# Altium footprint library Connector_PinHeader_1.00mm.PcbLib: 278 footprints (part 7 of 18)
Each footprint in its own frame and in the unit in brackets; x right, y up, seen from the top. Pads: shape width x height; smd on the part's side, far side on the other; paste and mask are expansions set on the pad; w line width, h text height; cw(c..) or ccw(c..) is an arc to the next point about the centre after c.
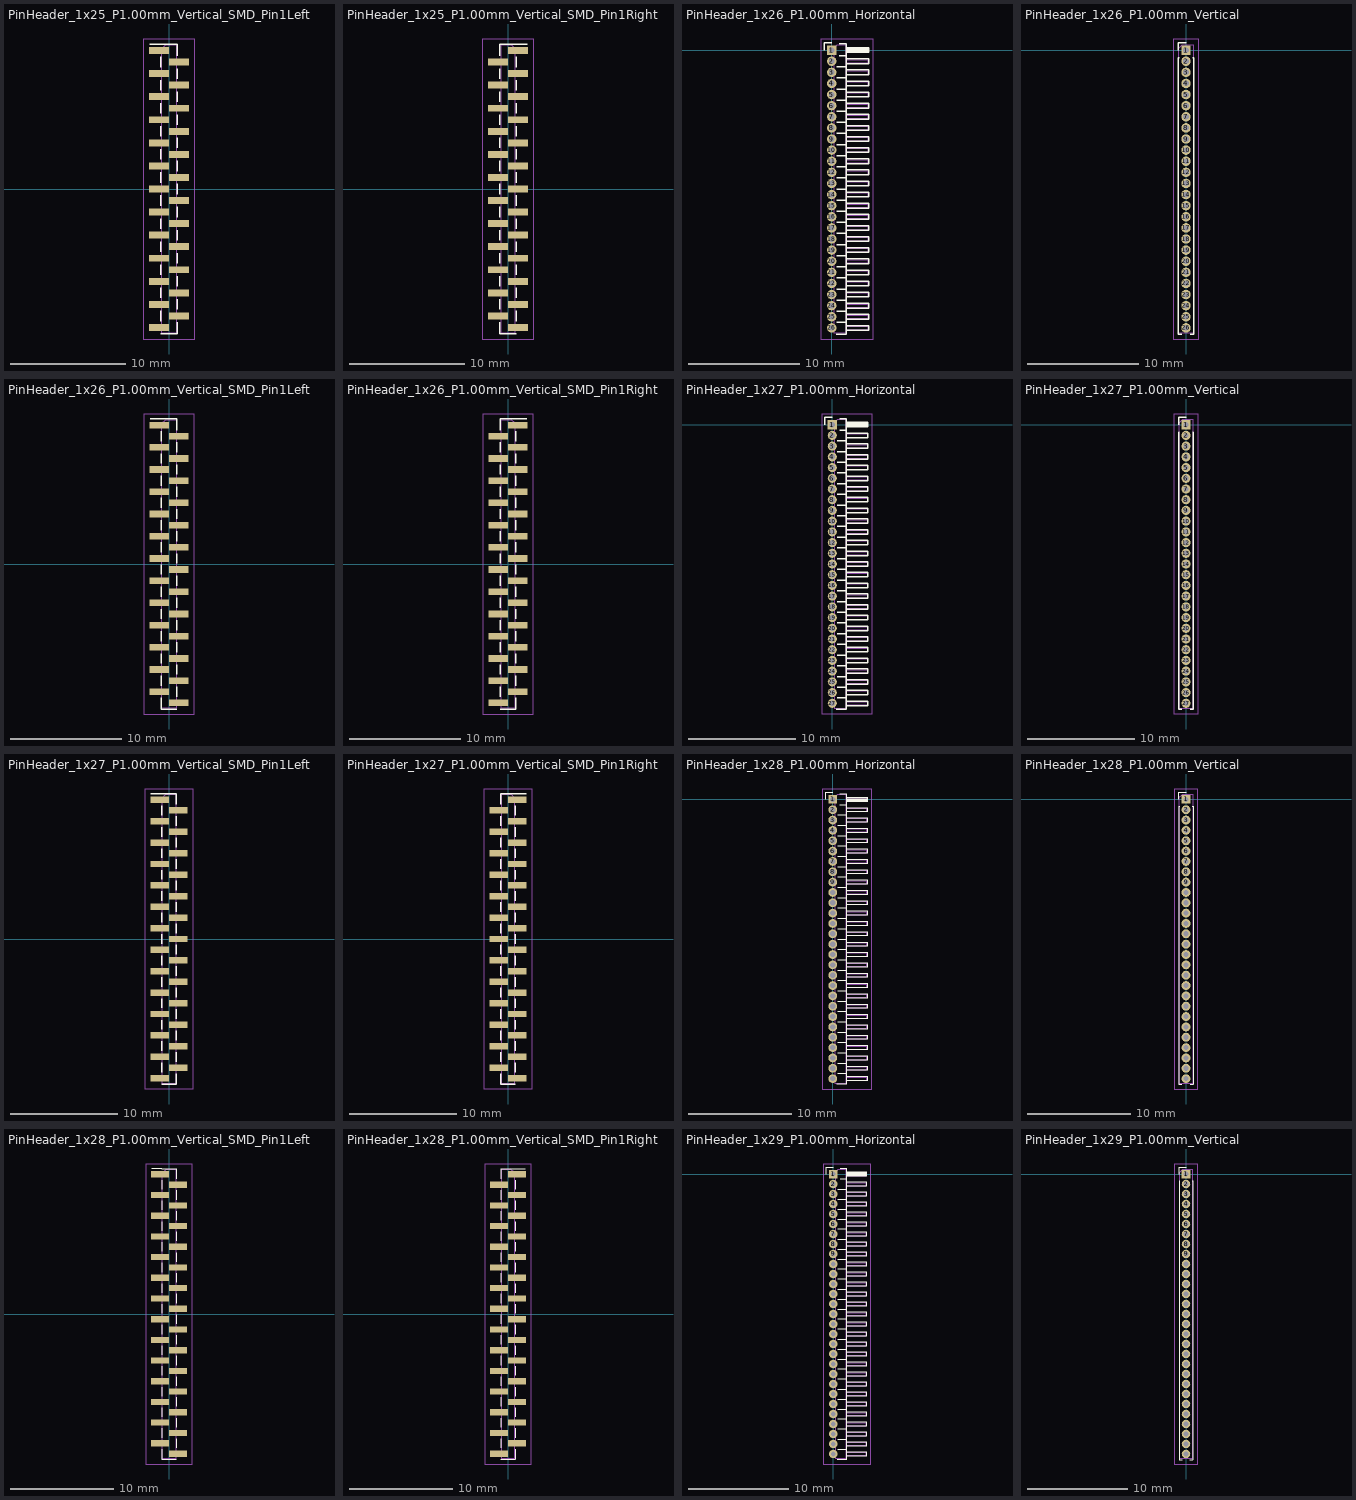
[diagram p6: the footprints below, top view; thin cyan lines are the x and y axes]

## PinHeader_1x25_P1.00mm_Vertical_SMD_Pin1Left [mm]
pads (25):
  rect 1.75x0.6 smd: 1(-0.875,12) 2(0.875,11) 3(-0.875,10) 4(0.875,9) 5(-0.875,8) 6(0.875,7) 7(-0.875,6) 8(0.875,5) 9(-0.875,4) 10(0.875,3) 11(-0.875,2) 12(0.875,1) 13(-0.875,0) 14(0.875,-1) 15(-0.875,-2) 16(0.875,-3) 17(-0.875,-4) 18(0.875,-5) 19(-0.875,-6) 20(0.875,-7) 21(-0.875,-8) 22(0.875,-9) 23(-0.875,-10) 24(0.875,-11) 25(-0.875,-12)
F.SilkS:
  lines w0.12: -1.69,12.56 -0.695,12.56 0.695,12.56 0.695,11.56 ; -0.695,-12.56 0.695,-12.56 0.695,-11.56 ; -0.695,-11.44 -0.695,-10.56 ; -0.695,-9.44 -0.695,-8.56 ; -0.695,-7.44 -0.695,-6.56 ; -0.695,-5.44 -0.695,-4.56 ; -0.695,-3.44 -0.695,-2.56 ; -0.695,-1.44 -0.695,-0.56 ; -0.695,0.56 -0.695,1.44 ; -0.695,2.56 -0.695,3.44 ; -0.695,4.56 -0.695,5.44 ; -0.695,6.56 -0.695,7.44 ; -0.695,8.56 -0.695,9.44 ; -0.695,10.56 -0.695,11.44 ; 0.695,-10.44 0.695,-9.56 ; 0.695,-8.44 0.695,-7.56 ; 0.695,-6.44 0.695,-5.56 ; 0.695,-4.44 0.695,-3.56 ; 0.695,-2.44 0.695,-1.56 ; 0.695,-0.44 0.695,0.44 ; 0.695,1.56 0.695,2.44 ; 0.695,3.56 0.695,4.44 ; 0.695,5.56 0.695,6.44 ; 0.695,7.56 0.695,8.44 ; 0.695,9.56 0.695,10.44
F.CrtYd:
  lines w0.05: -2.25,-13 2.25,-13 2.25,13 -2.25,13 -2.25,-13
F.Fab:
  lines w0.1: -0.635,-12.15 -1.25,-12.15 -1.25,-11.85 -0.635,-11.85 ; -0.635,-10.15 -1.25,-10.15 -1.25,-9.85 -0.635,-9.85 ; -0.635,-8.15 -1.25,-8.15 -1.25,-7.85 -0.635,-7.85 ; -0.635,-6.15 -1.25,-6.15 -1.25,-5.85 -0.635,-5.85 ; -0.635,-4.15 -1.25,-4.15 -1.25,-3.85 -0.635,-3.85 ; -0.635,-2.15 -1.25,-2.15 -1.25,-1.85 -0.635,-1.85 ; -0.635,-0.15 -1.25,-0.15 -1.25,0.15 -0.635,0.15 ; -0.635,1.85 -1.25,1.85 -1.25,2.15 -0.635,2.15 ; -0.635,3.85 -1.25,3.85 -1.25,4.15 -0.635,4.15 ; -0.635,5.85 -1.25,5.85 -1.25,6.15 -0.635,6.15 ; -0.635,7.85 -1.25,7.85 -1.25,8.15 -0.635,8.15 ; -0.635,9.85 -1.25,9.85 -1.25,10.15 -0.635,10.15 ; -0.635,11.85 -1.25,11.85 -1.25,12.15 -0.635,12.15 ; 0.635,-11.15 1.25,-11.15 1.25,-10.85 0.635,-10.85 ; 0.635,-9.15 1.25,-9.15 1.25,-8.85 0.635,-8.85 ; 0.635,-7.15 1.25,-7.15 1.25,-6.85 0.635,-6.85 ; 0.635,-5.15 1.25,-5.15 1.25,-4.85 0.635,-4.85 ; 0.635,-3.15 1.25,-3.15 1.25,-2.85 0.635,-2.85 ; 0.635,-1.15 1.25,-1.15 1.25,-0.85 0.635,-0.85 ; 0.635,0.85 1.25,0.85 1.25,1.15 0.635,1.15 ; 0.635,2.85 1.25,2.85 1.25,3.15 0.635,3.15 ; 0.635,4.85 1.25,4.85 1.25,5.15 0.635,5.15 ; 0.635,6.85 1.25,6.85 1.25,7.15 0.635,7.15 ; 0.635,8.85 1.25,8.85 1.25,9.15 0.635,9.15 ; 0.635,10.85 1.25,10.85 1.25,11.15 0.635,11.15 ; -0.635,12.15 -0.635,-12.5 0.635,-12.5 0.635,12.5 -0.285,12.5 -0.635,12.15
  text "'.Designator'" at 0.84,-4.047 h1

## PinHeader_1x25_P1.00mm_Vertical_SMD_Pin1Right [mm]
pads (25):
  rect 1.75x0.6 smd: 1(0.875,12) 2(-0.875,11) 3(0.875,10) 4(-0.875,9) 5(0.875,8) 6(-0.875,7) 7(0.875,6) 8(-0.875,5) 9(0.875,4) 10(-0.875,3) 11(0.875,2) 12(-0.875,1) 13(0.875,0) 14(-0.875,-1) 15(0.875,-2) 16(-0.875,-3) 17(0.875,-4) 18(-0.875,-5) 19(0.875,-6) 20(-0.875,-7) 21(0.875,-8) 22(-0.875,-9) 23(0.875,-10) 24(-0.875,-11) 25(0.875,-12)
F.SilkS:
  lines w0.12: -0.695,-11.56 -0.695,-12.56 0.695,-12.56 ; -0.695,-10.44 -0.695,-9.56 ; -0.695,-8.44 -0.695,-7.56 ; -0.695,-6.44 -0.695,-5.56 ; -0.695,-4.44 -0.695,-3.56 ; -0.695,-2.44 -0.695,-1.56 ; -0.695,-0.44 -0.695,0.44 ; -0.695,1.56 -0.695,2.44 ; -0.695,3.56 -0.695,4.44 ; -0.695,5.56 -0.695,6.44 ; -0.695,7.56 -0.695,8.44 ; -0.695,9.56 -0.695,10.44 ; -0.695,12.44 -0.695,11.56 -0.695,12.56 0.695,12.56 1.69,12.56 ; 0.695,-11.44 0.695,-10.56 ; 0.695,-9.44 0.695,-8.56 ; 0.695,-7.44 0.695,-6.56 ; 0.695,-5.44 0.695,-4.56 ; 0.695,-3.44 0.695,-2.56 ; 0.695,-1.44 0.695,-0.56 ; 0.695,0.56 0.695,1.44 ; 0.695,2.56 0.695,3.44 ; 0.695,4.56 0.695,5.44 ; 0.695,6.56 0.695,7.44 ; 0.695,8.56 0.695,9.44 ; 0.695,10.56 0.695,11.44
F.CrtYd:
  lines w0.05: -2.25,-13 2.25,-13 2.25,13 -2.25,13 -2.25,-13
F.Fab:
  lines w0.1: -0.635,-11.15 -1.25,-11.15 -1.25,-10.85 -0.635,-10.85 ; -0.635,-9.15 -1.25,-9.15 -1.25,-8.85 -0.635,-8.85 ; -0.635,-7.15 -1.25,-7.15 -1.25,-6.85 -0.635,-6.85 ; -0.635,-5.15 -1.25,-5.15 -1.25,-4.85 -0.635,-4.85 ; -0.635,-3.15 -1.25,-3.15 -1.25,-2.85 -0.635,-2.85 ; -0.635,-1.15 -1.25,-1.15 -1.25,-0.85 -0.635,-0.85 ; -0.635,0.85 -1.25,0.85 -1.25,1.15 -0.635,1.15 ; -0.635,2.85 -1.25,2.85 -1.25,3.15 -0.635,3.15 ; -0.635,4.85 -1.25,4.85 -1.25,5.15 -0.635,5.15 ; -0.635,6.85 -1.25,6.85 -1.25,7.15 -0.635,7.15 ; -0.635,8.85 -1.25,8.85 -1.25,9.15 -0.635,9.15 ; -0.635,10.85 -1.25,10.85 -1.25,11.15 -0.635,11.15 ; 0.635,-12.15 1.25,-12.15 1.25,-11.85 0.635,-11.85 ; 0.635,-10.15 1.25,-10.15 1.25,-9.85 0.635,-9.85 ; 0.635,-8.15 1.25,-8.15 1.25,-7.85 0.635,-7.85 ; 0.635,-6.15 1.25,-6.15 1.25,-5.85 0.635,-5.85 ; 0.635,-4.15 1.25,-4.15 1.25,-3.85 0.635,-3.85 ; 0.635,-2.15 1.25,-2.15 1.25,-1.85 0.635,-1.85 ; 0.635,-0.15 1.25,-0.15 1.25,0.15 0.635,0.15 ; 0.635,1.85 1.25,1.85 1.25,2.15 0.635,2.15 ; 0.635,3.85 1.25,3.85 1.25,4.15 0.635,4.15 ; 0.635,5.85 1.25,5.85 1.25,6.15 0.635,6.15 ; 0.635,7.85 1.25,7.85 1.25,8.15 0.635,8.15 ; 0.635,9.85 1.25,9.85 1.25,10.15 0.635,10.15 ; 0.635,11.85 1.25,11.85 1.25,12.15 0.635,12.15 ; 0.635,12.15 0.635,-12.5 -0.635,-12.5 -0.635,12.5 0.285,12.5 0.635,12.15
  text "'.Designator'" at 0.84,-4.047 h1

## PinHeader_1x26_P1.00mm_Horizontal [mm]
pads (26):
  rect 0.85x0.85 hole 0.5: 1(0,0)
  rrect100% 0.85x0.85 hole 0.5: 2(0,-1) 3(0,-2) 4(0,-3) 5(0,-4) 6(0,-5) 7(0,-6) 8(0,-7) 9(0,-8) 10(0,-9) 11(0,-10) 12(0,-11) 13(0,-12) 14(0,-13) 15(0,-14) 16(0,-15) 17(0,-16) 18(0,-17) 19(0,-18) 20(0,-19) 21(0,-20) 22(0,-21) 23(0,-22) 24(0,-23) 25(0,-24) 26(0,-25)
F.SilkS:
  lines w0.12: -0.685,0 -0.685,0.685 0,0.685 ; 0.394,-25.56 1.31,-25.56 1.31,0.56 0.685,0.56 ; 0.468,-24.5 1.31,-24.5 ; 0.468,-23.5 1.31,-23.5 ; 0.468,-22.5 1.31,-22.5 ; 0.468,-21.5 1.31,-21.5 ; 0.468,-20.5 1.31,-20.5 ; 0.468,-19.5 1.31,-19.5 ; 0.468,-18.5 1.31,-18.5 ; 0.468,-17.5 1.31,-17.5 ; 0.468,-16.5 1.31,-16.5 ; 0.468,-15.5 1.31,-15.5 ; 0.468,-14.5 1.31,-14.5 ; 0.468,-13.5 1.31,-13.5 ; 0.468,-12.5 1.31,-12.5 ; 0.468,-11.5 1.31,-11.5 ; 0.468,-10.5 1.31,-10.5 ; 0.468,-9.5 1.31,-9.5 ; 0.468,-8.5 1.31,-8.5 ; 0.468,-7.5 1.31,-7.5 ; 0.468,-6.5 1.31,-6.5 ; 0.468,-5.5 1.31,-5.5 ; 0.468,-4.5 1.31,-4.5 ; 0.468,-3.5 1.31,-3.5 ; 0.468,-2.5 1.31,-2.5 ; 0.468,-1.5 1.31,-1.5 ; 0.685,-0.5 1.31,-0.5 ; 1.31,-25.21 3.31,-25.21 3.31,-24.79 1.31,-24.79 ; 1.31,-24.21 3.31,-24.21 3.31,-23.79 1.31,-23.79 ; 1.31,-23.21 3.31,-23.21 3.31,-22.79 1.31,-22.79 ; 1.31,-22.21 3.31,-22.21 3.31,-21.79 1.31,-21.79 ; 1.31,-21.21 3.31,-21.21 3.31,-20.79 1.31,-20.79 ; 1.31,-20.21 3.31,-20.21 3.31,-19.79 1.31,-19.79 ; 1.31,-19.21 3.31,-19.21 3.31,-18.79 1.31,-18.79 ; 1.31,-18.21 3.31,-18.21 3.31,-17.79 1.31,-17.79 ; 1.31,-17.21 3.31,-17.21 3.31,-16.79 1.31,-16.79 ; 1.31,-16.21 3.31,-16.21 3.31,-15.79 1.31,-15.79 ; 1.31,-15.21 3.31,-15.21 3.31,-14.79 1.31,-14.79 ; 1.31,-14.21 3.31,-14.21 3.31,-13.79 1.31,-13.79 ; 1.31,-13.21 3.31,-13.21 3.31,-12.79 1.31,-12.79 ; 1.31,-12.21 3.31,-12.21 3.31,-11.79 1.31,-11.79 ; 1.31,-11.21 3.31,-11.21 3.31,-10.79 1.31,-10.79 ; 1.31,-10.21 3.31,-10.21 3.31,-9.79 1.31,-9.79 ; 1.31,-9.21 3.31,-9.21 3.31,-8.79 1.31,-8.79 ; 1.31,-8.21 3.31,-8.21 3.31,-7.79 1.31,-7.79 ; 1.31,-7.21 3.31,-7.21 3.31,-6.79 1.31,-6.79 ; 1.31,-6.21 3.31,-6.21 3.31,-5.79 1.31,-5.79 ; 1.31,-5.21 3.31,-5.21 3.31,-4.79 1.31,-4.79 ; 1.31,-4.21 3.31,-4.21 3.31,-3.79 1.31,-3.79 ; 1.31,-3.21 3.31,-3.21 3.31,-2.79 1.31,-2.79 ; 1.31,-2.21 3.31,-2.21 3.31,-1.79 1.31,-1.79 ; 1.31,-1.21 3.31,-1.21 3.31,-0.79 1.31,-0.79 ; 1.31,-0.21 3.31,-0.21 3.31,0.21 1.31,0.21 ; 1.31,-0.09 3.31,-0.09 ; 1.31,0.03 3.31,0.03 ; 1.31,0.15 3.31,0.15
F.CrtYd:
  lines w0.05: -1,-26 3.75,-26 3.75,1 -1,1 -1,-26
F.Fab:
  drawing of 161 lines, arcs and shapes, not listed
  text "'.Designator'" at 1.254,-14.928 h0.6

## PinHeader_1x26_P1.00mm_Vertical [mm]
pads (26):
  rect 0.85x0.85 hole 0.5: 1(0,0)
  rrect100% 0.85x0.85 hole 0.5: 2(0,-1) 3(0,-2) 4(0,-3) 5(0,-4) 6(0,-5) 7(0,-6) 8(0,-7) 9(0,-8) 10(0,-9) 11(0,-10) 12(0,-11) 13(0,-12) 14(0,-13) 15(0,-14) 16(0,-15) 17(0,-16) 18(0,-17) 19(0,-18) 20(0,-19) 21(0,-20) 22(0,-21) 23(0,-22) 24(0,-23) 25(0,-24) 26(0,-25)
F.SilkS:
  lines w0.12: -0.695,0 -0.695,0.685 0,0.685 ; -0.608,-0.685 -0.695,-0.685 -0.695,-25.56 -0.394,-25.56 ; 0.394,-25.56 0.695,-25.56 0.695,-0.685 0.608,-0.685
F.CrtYd:
  lines w0.05: -1.15,-26 1.15,-26 1.15,1 -1.15,1 -1.15,-26
F.Fab:
  lines w0.1: -0.635,-25.5 -0.635,0.182 -0.318,0.5 0.635,0.5 0.635,-25.5 -0.635,-25.5
  text "'.Designator'" at 0.639,-15.576 h0.76

## PinHeader_1x26_P1.00mm_Vertical_SMD_Pin1Left [mm]
pads (26):
  rect 1.75x0.6 smd: 1(-0.875,12.5) 2(0.875,11.5) 3(-0.875,10.5) 4(0.875,9.5) 5(-0.875,8.5) 6(0.875,7.5) 7(-0.875,6.5) 8(0.875,5.5) 9(-0.875,4.5) 10(0.875,3.5) 11(-0.875,2.5) 12(0.875,1.5) 13(-0.875,0.5) 14(0.875,-0.5) 15(-0.875,-1.5) 16(0.875,-2.5) 17(-0.875,-3.5) 18(0.875,-4.5) 19(-0.875,-5.5) 20(0.875,-6.5) 21(-0.875,-7.5) 22(0.875,-8.5) 23(-0.875,-9.5) 24(0.875,-10.5) 25(-0.875,-11.5) 26(0.875,-12.5)
F.SilkS:
  lines w0.12: -1.69,13.06 -0.695,13.06 0.695,13.06 0.695,12.06 ; -0.695,-12.06 -0.695,-13.06 0.695,-13.06 ; -0.695,-10.94 -0.695,-10.06 ; -0.695,-8.94 -0.695,-8.06 ; -0.695,-6.94 -0.695,-6.06 ; -0.695,-4.94 -0.695,-4.06 ; -0.695,-2.94 -0.695,-2.06 ; -0.695,-0.94 -0.695,-0.06 ; -0.695,1.06 -0.695,1.94 ; -0.695,3.06 -0.695,3.94 ; -0.695,5.06 -0.695,5.94 ; -0.695,7.06 -0.695,7.94 ; -0.695,9.06 -0.695,9.94 ; -0.695,11.06 -0.695,11.94 ; 0.695,-11.94 0.695,-11.06 ; 0.695,-9.94 0.695,-9.06 ; 0.695,-7.94 0.695,-7.06 ; 0.695,-5.94 0.695,-5.06 ; 0.695,-3.94 0.695,-3.06 ; 0.695,-1.94 0.695,-1.06 ; 0.695,0.06 0.695,0.94 ; 0.695,2.06 0.695,2.94 ; 0.695,4.06 0.695,4.94 ; 0.695,6.06 0.695,6.94 ; 0.695,8.06 0.695,8.94 ; 0.695,10.06 0.695,10.94
F.CrtYd:
  lines w0.05: -2.25,-13.5 2.25,-13.5 2.25,13.5 -2.25,13.5 -2.25,-13.5
F.Fab:
  lines w0.1: -0.635,-11.65 -1.25,-11.65 -1.25,-11.35 -0.635,-11.35 ; -0.635,-9.65 -1.25,-9.65 -1.25,-9.35 -0.635,-9.35 ; -0.635,-7.65 -1.25,-7.65 -1.25,-7.35 -0.635,-7.35 ; -0.635,-5.65 -1.25,-5.65 -1.25,-5.35 -0.635,-5.35 ; -0.635,-3.65 -1.25,-3.65 -1.25,-3.35 -0.635,-3.35 ; -0.635,-1.65 -1.25,-1.65 -1.25,-1.35 -0.635,-1.35 ; -0.635,0.35 -1.25,0.35 -1.25,0.65 -0.635,0.65 ; -0.635,2.35 -1.25,2.35 -1.25,2.65 -0.635,2.65 ; -0.635,4.35 -1.25,4.35 -1.25,4.65 -0.635,4.65 ; -0.635,6.35 -1.25,6.35 -1.25,6.65 -0.635,6.65 ; -0.635,8.35 -1.25,8.35 -1.25,8.65 -0.635,8.65 ; -0.635,10.35 -1.25,10.35 -1.25,10.65 -0.635,10.65 ; -0.635,12.35 -1.25,12.35 -1.25,12.65 -0.635,12.65 ; 0.635,-12.65 1.25,-12.65 1.25,-12.35 0.635,-12.35 ; 0.635,-10.65 1.25,-10.65 1.25,-10.35 0.635,-10.35 ; 0.635,-8.65 1.25,-8.65 1.25,-8.35 0.635,-8.35 ; 0.635,-6.65 1.25,-6.65 1.25,-6.35 0.635,-6.35 ; 0.635,-4.65 1.25,-4.65 1.25,-4.35 0.635,-4.35 ; 0.635,-2.65 1.25,-2.65 1.25,-2.35 0.635,-2.35 ; 0.635,-0.65 1.25,-0.65 1.25,-0.35 0.635,-0.35 ; 0.635,1.35 1.25,1.35 1.25,1.65 0.635,1.65 ; 0.635,3.35 1.25,3.35 1.25,3.65 0.635,3.65 ; 0.635,5.35 1.25,5.35 1.25,5.65 0.635,5.65 ; 0.635,7.35 1.25,7.35 1.25,7.65 0.635,7.65 ; 0.635,9.35 1.25,9.35 1.25,9.65 0.635,9.65 ; 0.635,11.35 1.25,11.35 1.25,11.65 0.635,11.65 ; -0.635,12.65 -0.635,-13 0.635,-13 0.635,13 -0.285,13 -0.635,12.65
  text "'.Designator'" at 0.84,-4.047 h1

## PinHeader_1x26_P1.00mm_Vertical_SMD_Pin1Right [mm]
pads (26):
  rect 1.75x0.6 smd: 1(0.875,12.5) 2(-0.875,11.5) 3(0.875,10.5) 4(-0.875,9.5) 5(0.875,8.5) 6(-0.875,7.5) 7(0.875,6.5) 8(-0.875,5.5) 9(0.875,4.5) 10(-0.875,3.5) 11(0.875,2.5) 12(-0.875,1.5) 13(0.875,0.5) 14(-0.875,-0.5) 15(0.875,-1.5) 16(-0.875,-2.5) 17(0.875,-3.5) 18(-0.875,-4.5) 19(0.875,-5.5) 20(-0.875,-6.5) 21(0.875,-7.5) 22(-0.875,-8.5) 23(0.875,-9.5) 24(-0.875,-10.5) 25(0.875,-11.5) 26(-0.875,-12.5)
F.SilkS:
  lines w0.12: -0.695,-13.06 0.695,-13.06 0.695,-12.06 ; -0.695,-11.94 -0.695,-11.06 ; -0.695,-9.94 -0.695,-9.06 ; -0.695,-7.94 -0.695,-7.06 ; -0.695,-5.94 -0.695,-5.06 ; -0.695,-3.94 -0.695,-3.06 ; -0.695,-1.94 -0.695,-1.06 ; -0.695,0.06 -0.695,0.94 ; -0.695,2.06 -0.695,2.94 ; -0.695,4.06 -0.695,4.94 ; -0.695,6.06 -0.695,6.94 ; -0.695,8.06 -0.695,8.94 ; -0.695,10.06 -0.695,10.94 ; -0.695,12.94 -0.695,12.06 -0.695,13.06 0.695,13.06 1.69,13.06 ; 0.695,-10.94 0.695,-10.06 ; 0.695,-8.94 0.695,-8.06 ; 0.695,-6.94 0.695,-6.06 ; 0.695,-4.94 0.695,-4.06 ; 0.695,-2.94 0.695,-2.06 ; 0.695,-0.94 0.695,-0.06 ; 0.695,1.06 0.695,1.94 ; 0.695,3.06 0.695,3.94 ; 0.695,5.06 0.695,5.94 ; 0.695,7.06 0.695,7.94 ; 0.695,9.06 0.695,9.94 ; 0.695,11.06 0.695,11.94
F.CrtYd:
  lines w0.05: -2.25,-13.5 2.25,-13.5 2.25,13.5 -2.25,13.5 -2.25,-13.5
F.Fab:
  lines w0.1: -0.635,-12.65 -1.25,-12.65 -1.25,-12.35 -0.635,-12.35 ; -0.635,-10.65 -1.25,-10.65 -1.25,-10.35 -0.635,-10.35 ; -0.635,-8.65 -1.25,-8.65 -1.25,-8.35 -0.635,-8.35 ; -0.635,-6.65 -1.25,-6.65 -1.25,-6.35 -0.635,-6.35 ; -0.635,-4.65 -1.25,-4.65 -1.25,-4.35 -0.635,-4.35 ; -0.635,-2.65 -1.25,-2.65 -1.25,-2.35 -0.635,-2.35 ; -0.635,-0.65 -1.25,-0.65 -1.25,-0.35 -0.635,-0.35 ; -0.635,1.35 -1.25,1.35 -1.25,1.65 -0.635,1.65 ; -0.635,3.35 -1.25,3.35 -1.25,3.65 -0.635,3.65 ; -0.635,5.35 -1.25,5.35 -1.25,5.65 -0.635,5.65 ; -0.635,7.35 -1.25,7.35 -1.25,7.65 -0.635,7.65 ; -0.635,9.35 -1.25,9.35 -1.25,9.65 -0.635,9.65 ; -0.635,11.35 -1.25,11.35 -1.25,11.65 -0.635,11.65 ; 0.635,-11.65 1.25,-11.65 1.25,-11.35 0.635,-11.35 ; 0.635,-9.65 1.25,-9.65 1.25,-9.35 0.635,-9.35 ; 0.635,-7.65 1.25,-7.65 1.25,-7.35 0.635,-7.35 ; 0.635,-5.65 1.25,-5.65 1.25,-5.35 0.635,-5.35 ; 0.635,-3.65 1.25,-3.65 1.25,-3.35 0.635,-3.35 ; 0.635,-1.65 1.25,-1.65 1.25,-1.35 0.635,-1.35 ; 0.635,0.35 1.25,0.35 1.25,0.65 0.635,0.65 ; 0.635,2.35 1.25,2.35 1.25,2.65 0.635,2.65 ; 0.635,4.35 1.25,4.35 1.25,4.65 0.635,4.65 ; 0.635,6.35 1.25,6.35 1.25,6.65 0.635,6.65 ; 0.635,8.35 1.25,8.35 1.25,8.65 0.635,8.65 ; 0.635,10.35 1.25,10.35 1.25,10.65 0.635,10.65 ; 0.635,12.35 1.25,12.35 1.25,12.65 0.635,12.65 ; 0.635,12.65 0.285,13 -0.635,13 -0.635,-13 0.635,-13 0.635,12.65
  text "'.Designator'" at 0.84,-4.047 h1

## PinHeader_1x27_P1.00mm_Horizontal [mm]
pads (27):
  rect 0.85x0.85 hole 0.5: 1(0,0)
  rrect100% 0.85x0.85 hole 0.5: 2(0,-1) 3(0,-2) 4(0,-3) 5(0,-4) 6(0,-5) 7(0,-6) 8(0,-7) 9(0,-8) 10(0,-9) 11(0,-10) 12(0,-11) 13(0,-12) 14(0,-13) 15(0,-14) 16(0,-15) 17(0,-16) 18(0,-17) 19(0,-18) 20(0,-19) 21(0,-20) 22(0,-21) 23(0,-22) 24(0,-23) 25(0,-24) 26(0,-25) 27(0,-26)
F.SilkS:
  lines w0.12: -0.685,0 -0.685,0.685 0,0.685 ; 0.394,-26.56 1.31,-26.56 1.31,0.56 0.685,0.56 ; 0.468,-25.5 1.31,-25.5 ; 0.468,-24.5 1.31,-24.5 ; 0.468,-23.5 1.31,-23.5 ; 0.468,-22.5 1.31,-22.5 ; 0.468,-21.5 1.31,-21.5 ; 0.468,-20.5 1.31,-20.5 ; 0.468,-19.5 1.31,-19.5 ; 0.468,-18.5 1.31,-18.5 ; 0.468,-17.5 1.31,-17.5 ; 0.468,-16.5 1.31,-16.5 ; 0.468,-15.5 1.31,-15.5 ; 0.468,-14.5 1.31,-14.5 ; 0.468,-13.5 1.31,-13.5 ; 0.468,-12.5 1.31,-12.5 ; 0.468,-11.5 1.31,-11.5 ; 0.468,-10.5 1.31,-10.5 ; 0.468,-9.5 1.31,-9.5 ; 0.468,-8.5 1.31,-8.5 ; 0.468,-7.5 1.31,-7.5 ; 0.468,-6.5 1.31,-6.5 ; 0.468,-5.5 1.31,-5.5 ; 0.468,-4.5 1.31,-4.5 ; 0.468,-3.5 1.31,-3.5 ; 0.468,-2.5 1.31,-2.5 ; 0.468,-1.5 1.31,-1.5 ; 0.685,-0.5 1.31,-0.5 ; 1.31,-26.21 3.31,-26.21 3.31,-25.79 1.31,-25.79 ; 1.31,-25.21 3.31,-25.21 3.31,-24.79 1.31,-24.79 ; 1.31,-24.21 3.31,-24.21 3.31,-23.79 1.31,-23.79 ; 1.31,-23.21 3.31,-23.21 3.31,-22.79 1.31,-22.79 ; 1.31,-22.21 3.31,-22.21 3.31,-21.79 1.31,-21.79 ; 1.31,-21.21 3.31,-21.21 3.31,-20.79 1.31,-20.79 ; 1.31,-20.21 3.31,-20.21 3.31,-19.79 1.31,-19.79 ; 1.31,-19.21 3.31,-19.21 3.31,-18.79 1.31,-18.79 ; 1.31,-18.21 3.31,-18.21 3.31,-17.79 1.31,-17.79 ; 1.31,-17.21 3.31,-17.21 3.31,-16.79 1.31,-16.79 ; 1.31,-16.21 3.31,-16.21 3.31,-15.79 1.31,-15.79 ; 1.31,-15.21 3.31,-15.21 3.31,-14.79 1.31,-14.79 ; 1.31,-14.21 3.31,-14.21 3.31,-13.79 1.31,-13.79 ; 1.31,-13.21 3.31,-13.21 3.31,-12.79 1.31,-12.79 ; 1.31,-12.21 3.31,-12.21 3.31,-11.79 1.31,-11.79 ; 1.31,-11.21 3.31,-11.21 3.31,-10.79 1.31,-10.79 ; 1.31,-10.21 3.31,-10.21 3.31,-9.79 1.31,-9.79 ; 1.31,-9.21 3.31,-9.21 3.31,-8.79 1.31,-8.79 ; 1.31,-8.21 3.31,-8.21 3.31,-7.79 1.31,-7.79 ; 1.31,-7.21 3.31,-7.21 3.31,-6.79 1.31,-6.79 ; 1.31,-6.21 3.31,-6.21 3.31,-5.79 1.31,-5.79 ; 1.31,-5.21 3.31,-5.21 3.31,-4.79 1.31,-4.79 ; 1.31,-4.21 3.31,-4.21 3.31,-3.79 1.31,-3.79 ; 1.31,-3.21 3.31,-3.21 3.31,-2.79 1.31,-2.79 ; 1.31,-2.21 3.31,-2.21 3.31,-1.79 1.31,-1.79 ; 1.31,-1.21 3.31,-1.21 3.31,-0.79 1.31,-0.79 ; 1.31,-0.21 3.31,-0.21 3.31,0.21 1.31,0.21 ; 1.31,-0.09 3.31,-0.09 ; 1.31,0.03 3.31,0.03 ; 1.31,0.15 3.31,0.15
F.CrtYd:
  lines w0.05: -1,-27 3.75,-27 3.75,1 -1,1 -1,-27
F.Fab:
  drawing of 167 lines, arcs and shapes, not listed
  text "'.Designator'" at 1.254,-15.428 h0.6

## PinHeader_1x27_P1.00mm_Vertical [mm]
pads (27):
  rect 0.85x0.85 hole 0.5: 1(0,0)
  rrect100% 0.85x0.85 hole 0.5: 2(0,-1) 3(0,-2) 4(0,-3) 5(0,-4) 6(0,-5) 7(0,-6) 8(0,-7) 9(0,-8) 10(0,-9) 11(0,-10) 12(0,-11) 13(0,-12) 14(0,-13) 15(0,-14) 16(0,-15) 17(0,-16) 18(0,-17) 19(0,-18) 20(0,-19) 21(0,-20) 22(0,-21) 23(0,-22) 24(0,-23) 25(0,-24) 26(0,-25) 27(0,-26)
F.SilkS:
  lines w0.12: -0.695,0 -0.695,0.685 0,0.685 ; -0.608,-0.685 -0.695,-0.685 -0.695,-26.56 -0.394,-26.56 ; 0.394,-26.56 0.695,-26.56 0.695,-0.685 0.608,-0.685
F.CrtYd:
  lines w0.05: -1.15,-27 -1.15,1 1.15,1 1.15,-27 -1.15,-27
F.Fab:
  lines w0.1: -0.635,-26.5 -0.635,0.182 -0.318,0.5 0.635,0.5 0.635,-26.5 -0.635,-26.5
  text "'.Designator'" at 0.639,-16.076 h0.76

## PinHeader_1x27_P1.00mm_Vertical_SMD_Pin1Left [mm]
pads (27):
  rect 1.75x0.6 smd: 1(-0.875,13) 2(0.875,12) 3(-0.875,11) 4(0.875,10) 5(-0.875,9) 6(0.875,8) 7(-0.875,7) 8(0.875,6) 9(-0.875,5) 10(0.875,4) 11(-0.875,3) 12(0.875,2) 13(-0.875,1) 14(0.875,0) 15(-0.875,-1) 16(0.875,-2) 17(-0.875,-3) 18(0.875,-4) 19(-0.875,-5) 20(0.875,-6) 21(-0.875,-7) 22(0.875,-8) 23(-0.875,-9) 24(0.875,-10) 25(-0.875,-11) 26(0.875,-12) 27(-0.875,-13)
F.SilkS:
  lines w0.12: -1.69,13.56 -0.695,13.56 0.695,13.56 0.695,12.56 ; -0.695,-13.56 0.695,-13.56 0.695,-12.56 ; -0.695,-12.44 -0.695,-11.56 ; -0.695,-10.44 -0.695,-9.56 ; -0.695,-8.44 -0.695,-7.56 ; -0.695,-6.44 -0.695,-5.56 ; -0.695,-4.44 -0.695,-3.56 ; -0.695,-2.44 -0.695,-1.56 ; -0.695,-0.44 -0.695,0.44 ; -0.695,1.56 -0.695,2.44 ; -0.695,3.56 -0.695,4.44 ; -0.695,5.56 -0.695,6.44 ; -0.695,7.56 -0.695,8.44 ; -0.695,9.56 -0.695,10.44 ; -0.695,11.56 -0.695,12.44 ; 0.695,-11.44 0.695,-10.56 ; 0.695,-9.44 0.695,-8.56 ; 0.695,-7.44 0.695,-6.56 ; 0.695,-5.44 0.695,-4.56 ; 0.695,-3.44 0.695,-2.56 ; 0.695,-1.44 0.695,-0.56 ; 0.695,0.56 0.695,1.44 ; 0.695,2.56 0.695,3.44 ; 0.695,4.56 0.695,5.44 ; 0.695,6.56 0.695,7.44 ; 0.695,8.56 0.695,9.44 ; 0.695,10.56 0.695,11.44
F.CrtYd:
  lines w0.05: -2.25,-14 2.25,-14 2.25,14 -2.25,14 -2.25,-14
F.Fab:
  lines w0.1: -0.635,-13.15 -1.25,-13.15 -1.25,-12.85 -0.635,-12.85 ; -0.635,-11.15 -1.25,-11.15 -1.25,-10.85 -0.635,-10.85 ; -0.635,-9.15 -1.25,-9.15 -1.25,-8.85 -0.635,-8.85 ; -0.635,-7.15 -1.25,-7.15 -1.25,-6.85 -0.635,-6.85 ; -0.635,-5.15 -1.25,-5.15 -1.25,-4.85 -0.635,-4.85 ; -0.635,-3.15 -1.25,-3.15 -1.25,-2.85 -0.635,-2.85 ; -0.635,-1.15 -1.25,-1.15 -1.25,-0.85 -0.635,-0.85 ; -0.635,0.85 -1.25,0.85 -1.25,1.15 -0.635,1.15 ; -0.635,2.85 -1.25,2.85 -1.25,3.15 -0.635,3.15 ; -0.635,4.85 -1.25,4.85 -1.25,5.15 -0.635,5.15 ; -0.635,6.85 -1.25,6.85 -1.25,7.15 -0.635,7.15 ; -0.635,8.85 -1.25,8.85 -1.25,9.15 -0.635,9.15 ; -0.635,10.85 -1.25,10.85 -1.25,11.15 -0.635,11.15 ; -0.635,12.85 -1.25,12.85 -1.25,13.15 -0.635,13.15 ; 0.635,-12.15 1.25,-12.15 1.25,-11.85 0.635,-11.85 ; 0.635,-10.15 1.25,-10.15 1.25,-9.85 0.635,-9.85 ; 0.635,-8.15 1.25,-8.15 1.25,-7.85 0.635,-7.85 ; 0.635,-6.15 1.25,-6.15 1.25,-5.85 0.635,-5.85 ; 0.635,-4.15 1.25,-4.15 1.25,-3.85 0.635,-3.85 ; 0.635,-2.15 1.25,-2.15 1.25,-1.85 0.635,-1.85 ; 0.635,-0.15 1.25,-0.15 1.25,0.15 0.635,0.15 ; 0.635,1.85 1.25,1.85 1.25,2.15 0.635,2.15 ; 0.635,3.85 1.25,3.85 1.25,4.15 0.635,4.15 ; 0.635,5.85 1.25,5.85 1.25,6.15 0.635,6.15 ; 0.635,7.85 1.25,7.85 1.25,8.15 0.635,8.15 ; 0.635,9.85 1.25,9.85 1.25,10.15 0.635,10.15 ; 0.635,11.85 1.25,11.85 1.25,12.15 0.635,12.15 ; -0.635,13.15 -0.635,-13.5 0.635,-13.5 0.635,13.5 -0.285,13.5 -0.635,13.15
  text "'.Designator'" at 0.84,-4.047 h1

## PinHeader_1x27_P1.00mm_Vertical_SMD_Pin1Right [mm]
pads (27):
  rect 1.75x0.6 smd: 1(0.875,13) 2(-0.875,12) 3(0.875,11) 4(-0.875,10) 5(0.875,9) 6(-0.875,8) 7(0.875,7) 8(-0.875,6) 9(0.875,5) 10(-0.875,4) 11(0.875,3) 12(-0.875,2) 13(0.875,1) 14(-0.875,0) 15(0.875,-1) 16(-0.875,-2) 17(0.875,-3) 18(-0.875,-4) 19(0.875,-5) 20(-0.875,-6) 21(0.875,-7) 22(-0.875,-8) 23(0.875,-9) 24(-0.875,-10) 25(0.875,-11) 26(-0.875,-12) 27(0.875,-13)
F.SilkS:
  lines w0.12: -0.695,-12.56 -0.695,-13.56 0.695,-13.56 ; -0.695,-11.44 -0.695,-10.56 ; -0.695,-9.44 -0.695,-8.56 ; -0.695,-7.44 -0.695,-6.56 ; -0.695,-5.44 -0.695,-4.56 ; -0.695,-3.44 -0.695,-2.56 ; -0.695,-1.44 -0.695,-0.56 ; -0.695,0.56 -0.695,1.44 ; -0.695,2.56 -0.695,3.44 ; -0.695,4.56 -0.695,5.44 ; -0.695,6.56 -0.695,7.44 ; -0.695,8.56 -0.695,9.44 ; -0.695,10.56 -0.695,11.44 ; -0.695,13.44 -0.695,12.56 -0.695,13.56 0.695,13.56 1.69,13.56 ; 0.695,-12.44 0.695,-11.56 ; 0.695,-10.44 0.695,-9.56 ; 0.695,-8.44 0.695,-7.56 ; 0.695,-6.44 0.695,-5.56 ; 0.695,-4.44 0.695,-3.56 ; 0.695,-2.44 0.695,-1.56 ; 0.695,-0.44 0.695,0.44 ; 0.695,1.56 0.695,2.44 ; 0.695,3.56 0.695,4.44 ; 0.695,5.56 0.695,6.44 ; 0.695,7.56 0.695,8.44 ; 0.695,9.56 0.695,10.44 ; 0.695,11.56 0.695,12.44
F.CrtYd:
  lines w0.05: -2.25,-14 -2.25,14 2.25,14 2.25,-14 -2.25,-14
F.Fab:
  lines w0.1: -0.635,-12.15 -1.25,-12.15 -1.25,-11.85 -0.635,-11.85 ; -0.635,-10.15 -1.25,-10.15 -1.25,-9.85 -0.635,-9.85 ; -0.635,-8.15 -1.25,-8.15 -1.25,-7.85 -0.635,-7.85 ; -0.635,-6.15 -1.25,-6.15 -1.25,-5.85 -0.635,-5.85 ; -0.635,-4.15 -1.25,-4.15 -1.25,-3.85 -0.635,-3.85 ; -0.635,-2.15 -1.25,-2.15 -1.25,-1.85 -0.635,-1.85 ; -0.635,-0.15 -1.25,-0.15 -1.25,0.15 -0.635,0.15 ; -0.635,1.85 -1.25,1.85 -1.25,2.15 -0.635,2.15 ; -0.635,3.85 -1.25,3.85 -1.25,4.15 -0.635,4.15 ; -0.635,5.85 -1.25,5.85 -1.25,6.15 -0.635,6.15 ; -0.635,7.85 -1.25,7.85 -1.25,8.15 -0.635,8.15 ; -0.635,9.85 -1.25,9.85 -1.25,10.15 -0.635,10.15 ; -0.635,11.85 -1.25,11.85 -1.25,12.15 -0.635,12.15 ; 0.635,-13.15 1.25,-13.15 1.25,-12.85 0.635,-12.85 ; 0.635,-11.15 1.25,-11.15 1.25,-10.85 0.635,-10.85 ; 0.635,-9.15 1.25,-9.15 1.25,-8.85 0.635,-8.85 ; 0.635,-7.15 1.25,-7.15 1.25,-6.85 0.635,-6.85 ; 0.635,-5.15 1.25,-5.15 1.25,-4.85 0.635,-4.85 ; 0.635,-3.15 1.25,-3.15 1.25,-2.85 0.635,-2.85 ; 0.635,-1.15 1.25,-1.15 1.25,-0.85 0.635,-0.85 ; 0.635,0.85 1.25,0.85 1.25,1.15 0.635,1.15 ; 0.635,2.85 1.25,2.85 1.25,3.15 0.635,3.15 ; 0.635,4.85 1.25,4.85 1.25,5.15 0.635,5.15 ; 0.635,6.85 1.25,6.85 1.25,7.15 0.635,7.15 ; 0.635,8.85 1.25,8.85 1.25,9.15 0.635,9.15 ; 0.635,10.85 1.25,10.85 1.25,11.15 0.635,11.15 ; 0.635,12.85 1.25,12.85 1.25,13.15 0.635,13.15 ; 0.635,13.15 0.635,-13.5 -0.635,-13.5 -0.635,13.5 0.285,13.5 0.635,13.15
  text "'.Designator'" at 0.84,-4.047 h1

## PinHeader_1x28_P1.00mm_Horizontal [mm]
pads (28):
  rect 0.85x0.85 hole 0.5: 1(0,0)
  rrect100% 0.85x0.85 hole 0.5: 2(0,-1) 3(0,-2) 4(0,-3) 5(0,-4) 6(0,-5) 7(0,-6) 8(0,-7) 9(0,-8) 10(0,-9) 11(0,-10) 12(0,-11) 13(0,-12) 14(0,-13) 15(0,-14) 16(0,-15) 17(0,-16) 18(0,-17) 19(0,-18) 20(0,-19) 21(0,-20) 22(0,-21) 23(0,-22) 24(0,-23) 25(0,-24) 26(0,-25) 27(0,-26) 28(0,-27)
F.SilkS:
  lines w0.12: -0.685,0 -0.685,0.685 0,0.685 ; 0.394,-27.56 1.31,-27.56 1.31,0.56 0.685,0.56 ; 0.468,-26.5 1.31,-26.5 ; 0.468,-25.5 1.31,-25.5 ; 0.468,-24.5 1.31,-24.5 ; 0.468,-23.5 1.31,-23.5 ; 0.468,-22.5 1.31,-22.5 ; 0.468,-21.5 1.31,-21.5 ; 0.468,-20.5 1.31,-20.5 ; 0.468,-19.5 1.31,-19.5 ; 0.468,-18.5 1.31,-18.5 ; 0.468,-17.5 1.31,-17.5 ; 0.468,-16.5 1.31,-16.5 ; 0.468,-15.5 1.31,-15.5 ; 0.468,-14.5 1.31,-14.5 ; 0.468,-13.5 1.31,-13.5 ; 0.468,-12.5 1.31,-12.5 ; 0.468,-11.5 1.31,-11.5 ; 0.468,-10.5 1.31,-10.5 ; 0.468,-9.5 1.31,-9.5 ; 0.468,-8.5 1.31,-8.5 ; 0.468,-7.5 1.31,-7.5 ; 0.468,-6.5 1.31,-6.5 ; 0.468,-5.5 1.31,-5.5 ; 0.468,-4.5 1.31,-4.5 ; 0.468,-3.5 1.31,-3.5 ; 0.468,-2.5 1.31,-2.5 ; 0.468,-1.5 1.31,-1.5 ; 0.685,-0.5 1.31,-0.5 ; 1.31,-27.21 3.31,-27.21 3.31,-26.79 1.31,-26.79 ; 1.31,-26.21 3.31,-26.21 3.31,-25.79 1.31,-25.79 ; 1.31,-25.21 3.31,-25.21 3.31,-24.79 1.31,-24.79 ; 1.31,-24.21 3.31,-24.21 3.31,-23.79 1.31,-23.79 ; 1.31,-23.21 3.31,-23.21 3.31,-22.79 1.31,-22.79 ; 1.31,-22.21 3.31,-22.21 3.31,-21.79 1.31,-21.79 ; 1.31,-21.21 3.31,-21.21 3.31,-20.79 1.31,-20.79 ; 1.31,-20.21 3.31,-20.21 3.31,-19.79 1.31,-19.79 ; 1.31,-19.21 3.31,-19.21 3.31,-18.79 1.31,-18.79 ; 1.31,-18.21 3.31,-18.21 3.31,-17.79 1.31,-17.79 ; 1.31,-17.21 3.31,-17.21 3.31,-16.79 1.31,-16.79 ; 1.31,-16.21 3.31,-16.21 3.31,-15.79 1.31,-15.79 ; 1.31,-15.21 3.31,-15.21 3.31,-14.79 1.31,-14.79 ; 1.31,-14.21 3.31,-14.21 3.31,-13.79 1.31,-13.79 ; 1.31,-13.21 3.31,-13.21 3.31,-12.79 1.31,-12.79 ; 1.31,-12.21 3.31,-12.21 3.31,-11.79 1.31,-11.79 ; 1.31,-11.21 3.31,-11.21 3.31,-10.79 1.31,-10.79 ; 1.31,-10.21 3.31,-10.21 3.31,-9.79 1.31,-9.79 ; 1.31,-9.21 3.31,-9.21 3.31,-8.79 1.31,-8.79 ; 1.31,-8.21 3.31,-8.21 3.31,-7.79 1.31,-7.79 ; 1.31,-7.21 3.31,-7.21 3.31,-6.79 1.31,-6.79 ; 1.31,-6.21 3.31,-6.21 3.31,-5.79 1.31,-5.79 ; 1.31,-5.21 3.31,-5.21 3.31,-4.79 1.31,-4.79 ; 1.31,-4.21 3.31,-4.21 3.31,-3.79 1.31,-3.79 ; 1.31,-3.21 3.31,-3.21 3.31,-2.79 1.31,-2.79 ; 1.31,-2.21 3.31,-2.21 3.31,-1.79 1.31,-1.79 ; 1.31,-1.21 3.31,-1.21 3.31,-0.79 1.31,-0.79 ; 1.31,-0.21 3.31,-0.21 3.31,0.21 1.31,0.21 ; 1.31,-0.09 3.31,-0.09 ; 1.31,0.03 3.31,0.03 ; 1.31,0.15 3.31,0.15
F.CrtYd:
  lines w0.05: -1,-28 3.75,-28 3.75,1 -1,1 -1,-28
F.Fab:
  drawing of 173 lines, arcs and shapes, not listed
  text "'.Designator'" at 1.254,-15.928 h0.6

## PinHeader_1x28_P1.00mm_Vertical [mm]
pads (28):
  rect 0.85x0.85 hole 0.5: 1(0,0)
  rrect100% 0.85x0.85 hole 0.5: 2(0,-1) 3(0,-2) 4(0,-3) 5(0,-4) 6(0,-5) 7(0,-6) 8(0,-7) 9(0,-8) 10(0,-9) 11(0,-10) 12(0,-11) 13(0,-12) 14(0,-13) 15(0,-14) 16(0,-15) 17(0,-16) 18(0,-17) 19(0,-18) 20(0,-19) 21(0,-20) 22(0,-21) 23(0,-22) 24(0,-23) 25(0,-24) 26(0,-25) 27(0,-26) 28(0,-27)
F.SilkS:
  lines w0.12: -0.695,0 -0.695,0.685 0,0.685 ; -0.608,-0.685 -0.695,-0.685 -0.695,-27.56 -0.394,-27.56 ; 0.394,-27.56 0.695,-27.56 0.695,-0.685 0.608,-0.685
F.CrtYd:
  lines w0.05: -1.15,-28 -1.15,1 1.15,1 1.15,-28 -1.15,-28
F.Fab:
  lines w0.1: -0.635,-27.5 -0.635,0.182 -0.318,0.5 0.635,0.5 0.635,-27.5 -0.635,-27.5
  text "'.Designator'" at 0.639,-16.576 h0.76

## PinHeader_1x28_P1.00mm_Vertical_SMD_Pin1Left [mm]
pads (28):
  rect 1.75x0.6 smd: 1(-0.875,13.5) 2(0.875,12.5) 3(-0.875,11.5) 4(0.875,10.5) 5(-0.875,9.5) 6(0.875,8.5) 7(-0.875,7.5) 8(0.875,6.5) 9(-0.875,5.5) 10(0.875,4.5) 11(-0.875,3.5) 12(0.875,2.5) 13(-0.875,1.5) 14(0.875,0.5) 15(-0.875,-0.5) 16(0.875,-1.5) 17(-0.875,-2.5) 18(0.875,-3.5) 19(-0.875,-4.5) 20(0.875,-5.5) 21(-0.875,-6.5) 22(0.875,-7.5) 23(-0.875,-8.5) 24(0.875,-9.5) 25(-0.875,-10.5) 26(0.875,-11.5) 27(-0.875,-12.5) 28(0.875,-13.5)
F.SilkS:
  lines w0.12: -1.69,14.06 -0.695,14.06 0.695,14.06 0.695,13.06 ; -0.695,-13.06 -0.695,-14.06 0.695,-14.06 ; -0.695,-11.94 -0.695,-11.06 ; -0.695,-9.94 -0.695,-9.06 ; -0.695,-7.94 -0.695,-7.06 ; -0.695,-5.94 -0.695,-5.06 ; -0.695,-3.94 -0.695,-3.06 ; -0.695,-1.94 -0.695,-1.06 ; -0.695,0.06 -0.695,0.94 ; -0.695,2.06 -0.695,2.94 ; -0.695,4.06 -0.695,4.94 ; -0.695,6.06 -0.695,6.94 ; -0.695,8.06 -0.695,8.94 ; -0.695,10.06 -0.695,10.94 ; -0.695,12.06 -0.695,12.94 ; 0.695,-12.94 0.695,-12.06 ; 0.695,-10.94 0.695,-10.06 ; 0.695,-8.94 0.695,-8.06 ; 0.695,-6.94 0.695,-6.06 ; 0.695,-4.94 0.695,-4.06 ; 0.695,-2.94 0.695,-2.06 ; 0.695,-0.94 0.695,-0.06 ; 0.695,1.06 0.695,1.94 ; 0.695,3.06 0.695,3.94 ; 0.695,5.06 0.695,5.94 ; 0.695,7.06 0.695,7.94 ; 0.695,9.06 0.695,9.94 ; 0.695,11.06 0.695,11.94
F.CrtYd:
  lines w0.05: -2.25,-14.5 -2.25,14.5 2.25,14.5 2.25,-14.5 -2.25,-14.5
F.Fab:
  lines w0.1: -0.635,-12.65 -1.25,-12.65 -1.25,-12.35 -0.635,-12.35 ; -0.635,-10.65 -1.25,-10.65 -1.25,-10.35 -0.635,-10.35 ; -0.635,-8.65 -1.25,-8.65 -1.25,-8.35 -0.635,-8.35 ; -0.635,-6.65 -1.25,-6.65 -1.25,-6.35 -0.635,-6.35 ; -0.635,-4.65 -1.25,-4.65 -1.25,-4.35 -0.635,-4.35 ; -0.635,-2.65 -1.25,-2.65 -1.25,-2.35 -0.635,-2.35 ; -0.635,-0.65 -1.25,-0.65 -1.25,-0.35 -0.635,-0.35 ; -0.635,1.35 -1.25,1.35 -1.25,1.65 -0.635,1.65 ; -0.635,3.35 -1.25,3.35 -1.25,3.65 -0.635,3.65 ; -0.635,5.35 -1.25,5.35 -1.25,5.65 -0.635,5.65 ; -0.635,7.35 -1.25,7.35 -1.25,7.65 -0.635,7.65 ; -0.635,9.35 -1.25,9.35 -1.25,9.65 -0.635,9.65 ; -0.635,11.35 -1.25,11.35 -1.25,11.65 -0.635,11.65 ; -0.635,13.35 -1.25,13.35 -1.25,13.65 -0.635,13.65 ; 0.635,-13.65 1.25,-13.65 1.25,-13.35 0.635,-13.35 ; 0.635,-11.65 1.25,-11.65 1.25,-11.35 0.635,-11.35 ; 0.635,-9.65 1.25,-9.65 1.25,-9.35 0.635,-9.35 ; 0.635,-7.65 1.25,-7.65 1.25,-7.35 0.635,-7.35 ; 0.635,-5.65 1.25,-5.65 1.25,-5.35 0.635,-5.35 ; 0.635,-3.65 1.25,-3.65 1.25,-3.35 0.635,-3.35 ; 0.635,-1.65 1.25,-1.65 1.25,-1.35 0.635,-1.35 ; 0.635,0.35 1.25,0.35 1.25,0.65 0.635,0.65 ; 0.635,2.35 1.25,2.35 1.25,2.65 0.635,2.65 ; 0.635,4.35 1.25,4.35 1.25,4.65 0.635,4.65 ; 0.635,6.35 1.25,6.35 1.25,6.65 0.635,6.65 ; 0.635,8.35 1.25,8.35 1.25,8.65 0.635,8.65 ; 0.635,10.35 1.25,10.35 1.25,10.65 0.635,10.65 ; 0.635,12.35 1.25,12.35 1.25,12.65 0.635,12.65 ; -0.635,13.65 -0.285,14 0.635,14 0.635,-14 -0.635,-14 -0.635,13.65
  text "'.Designator'" at 0.84,-4.047 h1

## PinHeader_1x28_P1.00mm_Vertical_SMD_Pin1Right [mm]
pads (28):
  rect 1.75x0.6 smd: 1(0.875,13.5) 2(-0.875,12.5) 3(0.875,11.5) 4(-0.875,10.5) 5(0.875,9.5) 6(-0.875,8.5) 7(0.875,7.5) 8(-0.875,6.5) 9(0.875,5.5) 10(-0.875,4.5) 11(0.875,3.5) 12(-0.875,2.5) 13(0.875,1.5) 14(-0.875,0.5) 15(0.875,-0.5) 16(-0.875,-1.5) 17(0.875,-2.5) 18(-0.875,-3.5) 19(0.875,-4.5) 20(-0.875,-5.5) 21(0.875,-6.5) 22(-0.875,-7.5) 23(0.875,-8.5) 24(-0.875,-9.5) 25(0.875,-10.5) 26(-0.875,-11.5) 27(0.875,-12.5) 28(-0.875,-13.5)
F.SilkS:
  lines w0.12: -0.695,-14.06 0.695,-14.06 0.695,-13.06 ; -0.695,-12.94 -0.695,-12.06 ; -0.695,-10.94 -0.695,-10.06 ; -0.695,-8.94 -0.695,-8.06 ; -0.695,-6.94 -0.695,-6.06 ; -0.695,-4.94 -0.695,-4.06 ; -0.695,-2.94 -0.695,-2.06 ; -0.695,-0.94 -0.695,-0.06 ; -0.695,1.06 -0.695,1.94 ; -0.695,3.06 -0.695,3.94 ; -0.695,5.06 -0.695,5.94 ; -0.695,7.06 -0.695,7.94 ; -0.695,9.06 -0.695,9.94 ; -0.695,11.06 -0.695,11.94 ; -0.695,13.94 -0.695,13.06 -0.695,14.06 0.695,14.06 1.69,14.06 ; 0.695,-11.94 0.695,-11.06 ; 0.695,-9.94 0.695,-9.06 ; 0.695,-7.94 0.695,-7.06 ; 0.695,-5.94 0.695,-5.06 ; 0.695,-3.94 0.695,-3.06 ; 0.695,-1.94 0.695,-1.06 ; 0.695,0.06 0.695,0.94 ; 0.695,2.06 0.695,2.94 ; 0.695,4.06 0.695,4.94 ; 0.695,6.06 0.695,6.94 ; 0.695,8.06 0.695,8.94 ; 0.695,10.06 0.695,10.94 ; 0.695,12.06 0.695,12.94
F.CrtYd:
  lines w0.05: -2.25,-14.5 -2.25,14.5 2.25,14.5 2.25,-14.5 -2.25,-14.5
F.Fab:
  lines w0.1: -0.635,-13.65 -1.25,-13.65 -1.25,-13.35 -0.635,-13.35 ; -0.635,-11.65 -1.25,-11.65 -1.25,-11.35 -0.635,-11.35 ; -0.635,-9.65 -1.25,-9.65 -1.25,-9.35 -0.635,-9.35 ; -0.635,-7.65 -1.25,-7.65 -1.25,-7.35 -0.635,-7.35 ; -0.635,-5.65 -1.25,-5.65 -1.25,-5.35 -0.635,-5.35 ; -0.635,-3.65 -1.25,-3.65 -1.25,-3.35 -0.635,-3.35 ; -0.635,-1.65 -1.25,-1.65 -1.25,-1.35 -0.635,-1.35 ; -0.635,0.35 -1.25,0.35 -1.25,0.65 -0.635,0.65 ; -0.635,2.35 -1.25,2.35 -1.25,2.65 -0.635,2.65 ; -0.635,4.35 -1.25,4.35 -1.25,4.65 -0.635,4.65 ; -0.635,6.35 -1.25,6.35 -1.25,6.65 -0.635,6.65 ; -0.635,8.35 -1.25,8.35 -1.25,8.65 -0.635,8.65 ; -0.635,10.35 -1.25,10.35 -1.25,10.65 -0.635,10.65 ; -0.635,12.35 -1.25,12.35 -1.25,12.65 -0.635,12.65 ; 0.635,-12.65 1.25,-12.65 1.25,-12.35 0.635,-12.35 ; 0.635,-10.65 1.25,-10.65 1.25,-10.35 0.635,-10.35 ; 0.635,-8.65 1.25,-8.65 1.25,-8.35 0.635,-8.35 ; 0.635,-6.65 1.25,-6.65 1.25,-6.35 0.635,-6.35 ; 0.635,-4.65 1.25,-4.65 1.25,-4.35 0.635,-4.35 ; 0.635,-2.65 1.25,-2.65 1.25,-2.35 0.635,-2.35 ; 0.635,-0.65 1.25,-0.65 1.25,-0.35 0.635,-0.35 ; 0.635,1.35 1.25,1.35 1.25,1.65 0.635,1.65 ; 0.635,3.35 1.25,3.35 1.25,3.65 0.635,3.65 ; 0.635,5.35 1.25,5.35 1.25,5.65 0.635,5.65 ; 0.635,7.35 1.25,7.35 1.25,7.65 0.635,7.65 ; 0.635,9.35 1.25,9.35 1.25,9.65 0.635,9.65 ; 0.635,11.35 1.25,11.35 1.25,11.65 0.635,11.65 ; 0.635,13.35 1.25,13.35 1.25,13.65 0.635,13.65 ; 0.635,13.65 0.285,14 -0.635,14 -0.635,-14 0.635,-14 0.635,13.65
  text "'.Designator'" at 0.84,-4.047 h1

## PinHeader_1x29_P1.00mm_Horizontal [mm]
pads (29):
  rect 0.85x0.85 hole 0.5: 1(0,0)
  rrect100% 0.85x0.85 hole 0.5: 2(0,-1) 3(0,-2) 4(0,-3) 5(0,-4) 6(0,-5) 7(0,-6) 8(0,-7) 9(0,-8) 10(0,-9) 11(0,-10) 12(0,-11) 13(0,-12) 14(0,-13) 15(0,-14) 16(0,-15) 17(0,-16) 18(0,-17) 19(0,-18) 20(0,-19) 21(0,-20) 22(0,-21) 23(0,-22) 24(0,-23) 25(0,-24) 26(0,-25) 27(0,-26) 28(0,-27) 29(0,-28)
F.SilkS:
  lines w0.12: -0.685,0 -0.685,0.685 0,0.685 ; 0.394,-28.56 1.31,-28.56 1.31,0.56 0.685,0.56 ; 0.468,-27.5 1.31,-27.5 ; 0.468,-26.5 1.31,-26.5 ; 0.468,-25.5 1.31,-25.5 ; 0.468,-24.5 1.31,-24.5 ; 0.468,-23.5 1.31,-23.5 ; 0.468,-22.5 1.31,-22.5 ; 0.468,-21.5 1.31,-21.5 ; 0.468,-20.5 1.31,-20.5 ; 0.468,-19.5 1.31,-19.5 ; 0.468,-18.5 1.31,-18.5 ; 0.468,-17.5 1.31,-17.5 ; 0.468,-16.5 1.31,-16.5 ; 0.468,-15.5 1.31,-15.5 ; 0.468,-14.5 1.31,-14.5 ; 0.468,-13.5 1.31,-13.5 ; 0.468,-12.5 1.31,-12.5 ; 0.468,-11.5 1.31,-11.5 ; 0.468,-10.5 1.31,-10.5 ; 0.468,-9.5 1.31,-9.5 ; 0.468,-8.5 1.31,-8.5 ; 0.468,-7.5 1.31,-7.5 ; 0.468,-6.5 1.31,-6.5 ; 0.468,-5.5 1.31,-5.5 ; 0.468,-4.5 1.31,-4.5 ; 0.468,-3.5 1.31,-3.5 ; 0.468,-2.5 1.31,-2.5 ; 0.468,-1.5 1.31,-1.5 ; 0.685,-0.5 1.31,-0.5 ; 1.31,-28.21 3.31,-28.21 3.31,-27.79 1.31,-27.79 ; 1.31,-27.21 3.31,-27.21 3.31,-26.79 1.31,-26.79 ; 1.31,-26.21 3.31,-26.21 3.31,-25.79 1.31,-25.79 ; 1.31,-25.21 3.31,-25.21 3.31,-24.79 1.31,-24.79 ; 1.31,-24.21 3.31,-24.21 3.31,-23.79 1.31,-23.79 ; 1.31,-23.21 3.31,-23.21 3.31,-22.79 1.31,-22.79 ; 1.31,-22.21 3.31,-22.21 3.31,-21.79 1.31,-21.79 ; 1.31,-21.21 3.31,-21.21 3.31,-20.79 1.31,-20.79 ; 1.31,-20.21 3.31,-20.21 3.31,-19.79 1.31,-19.79 ; 1.31,-19.21 3.31,-19.21 3.31,-18.79 1.31,-18.79 ; 1.31,-18.21 3.31,-18.21 3.31,-17.79 1.31,-17.79 ; 1.31,-17.21 3.31,-17.21 3.31,-16.79 1.31,-16.79 ; 1.31,-16.21 3.31,-16.21 3.31,-15.79 1.31,-15.79 ; 1.31,-15.21 3.31,-15.21 3.31,-14.79 1.31,-14.79 ; 1.31,-14.21 3.31,-14.21 3.31,-13.79 1.31,-13.79 ; 1.31,-13.21 3.31,-13.21 3.31,-12.79 1.31,-12.79 ; 1.31,-12.21 3.31,-12.21 3.31,-11.79 1.31,-11.79 ; 1.31,-11.21 3.31,-11.21 3.31,-10.79 1.31,-10.79 ; 1.31,-10.21 3.31,-10.21 3.31,-9.79 1.31,-9.79 ; 1.31,-9.21 3.31,-9.21 3.31,-8.79 1.31,-8.79 ; 1.31,-8.21 3.31,-8.21 3.31,-7.79 1.31,-7.79 ; 1.31,-7.21 3.31,-7.21 3.31,-6.79 1.31,-6.79 ; 1.31,-6.21 3.31,-6.21 3.31,-5.79 1.31,-5.79 ; 1.31,-5.21 3.31,-5.21 3.31,-4.79 1.31,-4.79 ; 1.31,-4.21 3.31,-4.21 3.31,-3.79 1.31,-3.79 ; 1.31,-3.21 3.31,-3.21 3.31,-2.79 1.31,-2.79 ; 1.31,-2.21 3.31,-2.21 3.31,-1.79 1.31,-1.79 ; 1.31,-1.21 3.31,-1.21 3.31,-0.79 1.31,-0.79 ; 1.31,-0.21 3.31,-0.21 3.31,0.21 1.31,0.21 ; 1.31,-0.09 3.31,-0.09 ; 1.31,0.03 3.31,0.03 ; 1.31,0.15 3.31,0.15
F.CrtYd:
  lines w0.05: -1,-29 -1,1 3.75,1 3.75,-29 -1,-29
F.Fab:
  drawing of 179 lines, arcs and shapes, not listed
  text "'.Designator'" at 1.254,-16.428 h0.6

## PinHeader_1x29_P1.00mm_Vertical [mm]
pads (29):
  rect 0.85x0.85 hole 0.5: 1(0,0)
  rrect100% 0.85x0.85 hole 0.5: 2(0,-1) 3(0,-2) 4(0,-3) 5(0,-4) 6(0,-5) 7(0,-6) 8(0,-7) 9(0,-8) 10(0,-9) 11(0,-10) 12(0,-11) 13(0,-12) 14(0,-13) 15(0,-14) 16(0,-15) 17(0,-16) 18(0,-17) 19(0,-18) 20(0,-19) 21(0,-20) 22(0,-21) 23(0,-22) 24(0,-23) 25(0,-24) 26(0,-25) 27(0,-26) 28(0,-27) 29(0,-28)
F.SilkS:
  lines w0.12: -0.695,0 -0.695,0.685 0,0.685 ; -0.608,-0.685 -0.695,-0.685 -0.695,-28.56 -0.394,-28.56 ; 0.394,-28.56 0.695,-28.56 0.695,-0.685 0.608,-0.685
F.CrtYd:
  lines w0.05: -1.15,-29 -1.15,1 1.15,1 1.15,-29 -1.15,-29
F.Fab:
  lines w0.1: -0.635,-28.5 -0.635,0.182 -0.318,0.5 0.635,0.5 0.635,-28.5 -0.635,-28.5
  text "'.Designator'" at 0.639,-17.076 h0.76